# Altium footprint library HW_HOLLAND_NCDM_MONITOR_R1.PcbLib: 472 footprints (part 4 of 30)
Each footprint in its own frame and in the unit in brackets; x right, y up, seen from the top. Pads: shape width x height; smd on the part's side, far side on the other; paste and mask are expansions set on the pad; w line width, h text height; cw(c..) or ccw(c..) is an arc to the next point about the centre after c.
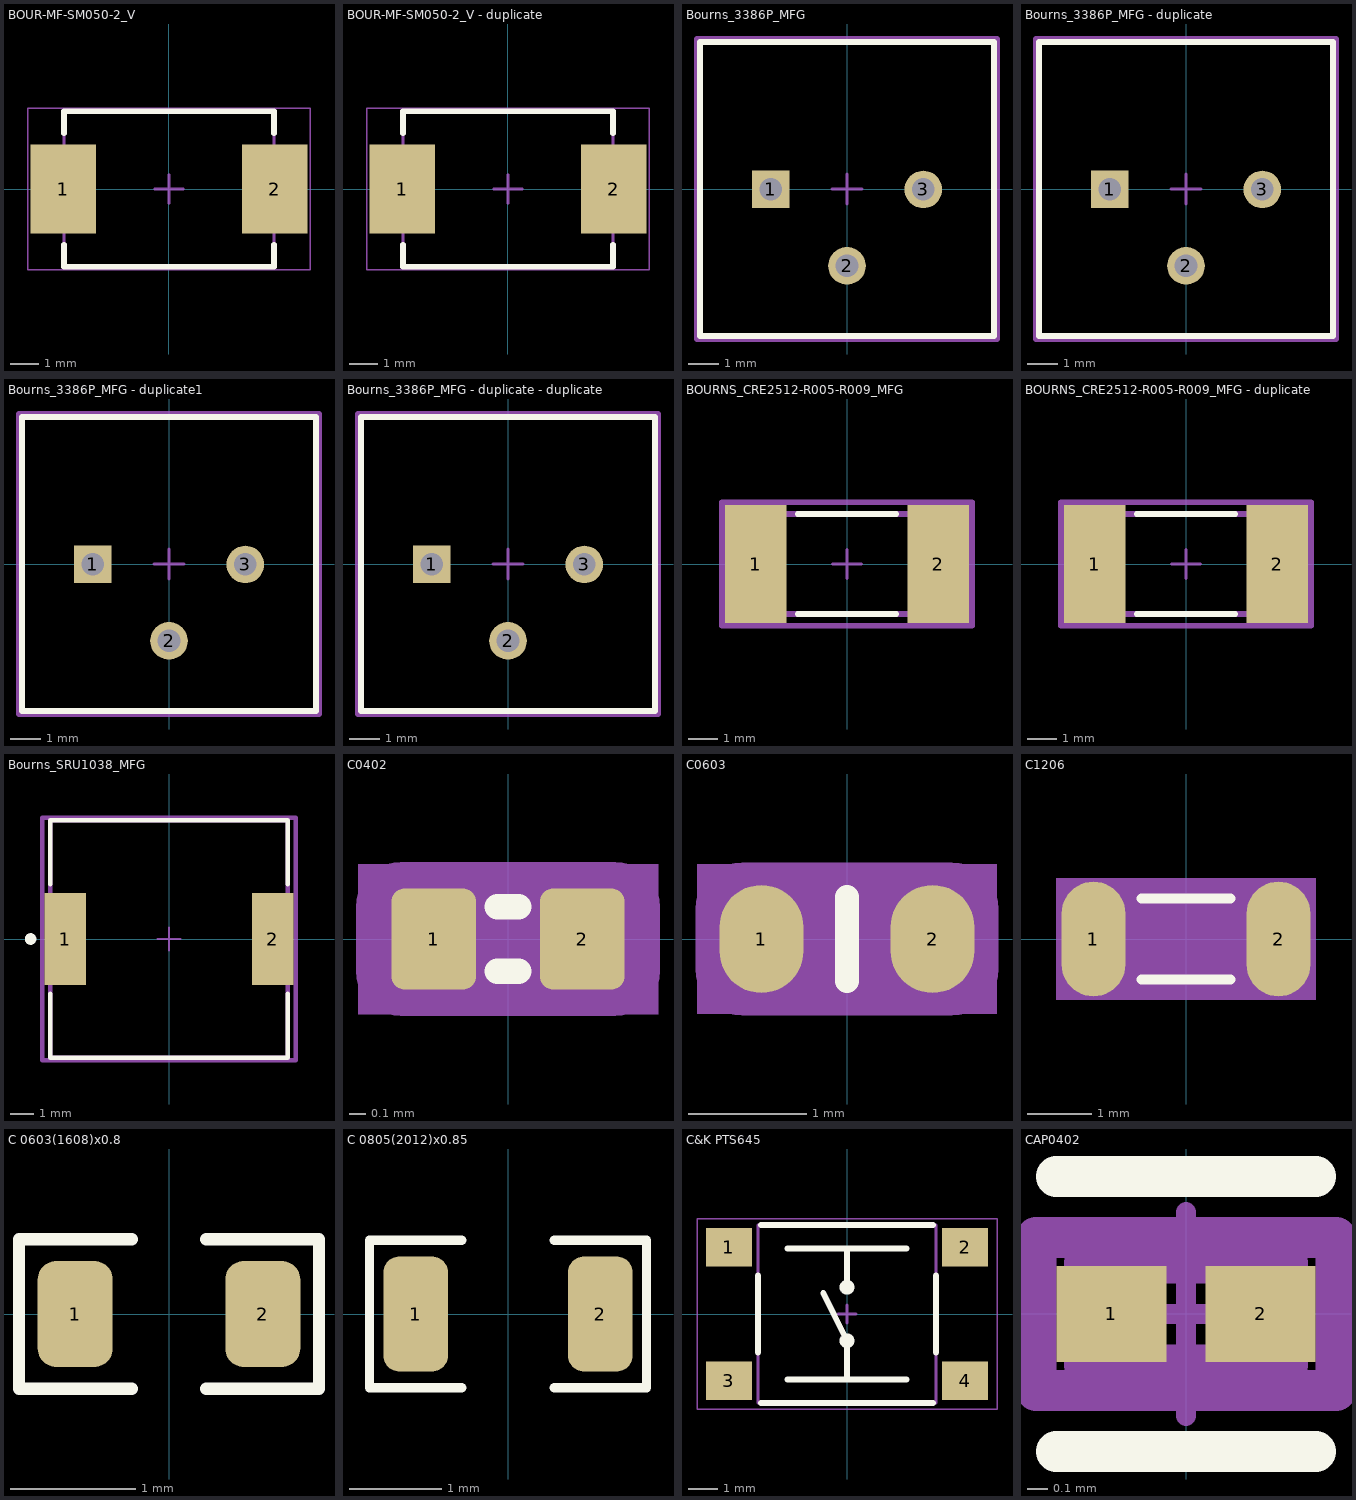
[diagram p3: the footprints below, top view; thin cyan lines are the x and y axes]

## BOUR-MF-SM050-2_V [mm]
pads (2):
  rect 2.3x3.1 smd: 1(-3.7,0) 2(3.7,0)
Top Overlay:
  lines w0.2: -3.677,-1.95 -3.677,-2.72 3.678,-2.72 3.678,-1.95 ; -3.677,1.95 -3.677,2.72 3.678,2.72 3.678,1.95
Mechanical 13:
  lines w0.1: -3.677,-2.72 -3.677,2.72 3.678,2.72 3.678,-2.72 -3.677,-2.72
Mechanical 15:
  lines w0.05: -4.95,-2.82 -4.95,2.82 4.95,2.82 4.95,-2.82 -4.95,-2.82
  lines w0.1: -0.5,0 0.5,0 ; 0,-0.5 0,0.5
3D body "mf-sm050.stp": height 3.18, standoff 0, extent -3.677,-2.72 3.678,2.72

## BOUR-MF-SM050-2_V - duplicate [mm]
pads (2):
  rect 2.3x3.1 smd: 1(-3.7,0) 2(3.7,0)
Top Overlay:
  lines w0.2: -3.677,-1.95 -3.677,-2.72 3.678,-2.72 3.678,-1.95 ; -3.677,1.95 -3.677,2.72 3.678,2.72 3.678,1.95
Mechanical 13:
  lines w0.1: -3.677,-2.72 3.678,-2.72 3.678,2.72 -3.677,2.72 -3.677,-2.72
Mechanical 15:
  lines w0.05: -4.95,-2.82 4.95,-2.82 4.95,2.82 -4.95,2.82 -4.95,-2.82
  lines w0.1: -0.5,0 0.5,0 ; 0,-0.5 0,0.5
3D body "mf-sm050.stp": height 3.18, standoff 0, extent -3.677,-2.72 3.678,2.72

## Bourns_3386P_MFG [mm]
pads (3):
  rect 1.25x1.25 hole 0.75 paste-2539.97 mask+0: 1(-2.54,-0.015)
  round 1.25 hole 0.75 paste-2539.97 mask+0: 2(0,-2.555) 3(2.54,-0.015)
Top Overlay:
  lines w0.2: -4.89,-4.89 -4.89,4.89 4.89,4.89 4.89,-4.89 -4.89,-4.89
Top Courtyard:
  lines w0.2: -4.99,-4.99 -4.99,4.99 4.99,4.99 4.99,-4.99 -4.99,-4.99
  text ".Designator" at 0,0 h1
Mechanical 12:
  lines w0.2: -4.89,-4.89 -4.89,4.89 4.89,4.89 4.89,-4.89 -4.89,-4.89
Mechanical 15:
  lines w0.1: -0.5,0 0.5,0 ; 0,-0.5 0,0.5
  lines w0.2: -4.99,-4.99 -4.99,4.99 4.99,4.99 4.99,-4.99 -4.99,-4.99
3D body "Res_Bourns_3386P-1-104LF_eec.STEP": height 0.25, standoff 0, extent -4.99,-4.99 4.99,4.99

## Bourns_3386P_MFG - duplicate [mm]
pads (3):
  rect 1.25x1.25 hole 0.75 paste-2539.97 mask+0: 1(-2.54,-0.015)
  round 1.25 hole 0.75 paste-2539.97 mask+0: 2(0,-2.555) 3(2.54,-0.015)
Top Overlay:
  lines w0.2: -4.89,-4.89 -4.89,4.89 4.89,4.89 4.89,-4.89 -4.89,-4.89
Top Courtyard:
  lines w0.2: -4.99,-4.99 -4.99,4.99 4.99,4.99 4.99,-4.99 -4.99,-4.99
  text ".Designator" at 0,0 h1
Mechanical 12:
  lines w0.2: -4.89,-4.89 -4.89,4.89 4.89,4.89 4.89,-4.89 -4.89,-4.89
Mechanical 15:
  lines w0.1: -0.5,0 0.5,0 ; 0,-0.5 0,0.5
  lines w0.2: -4.99,-4.99 -4.99,4.99 4.99,4.99 4.99,-4.99 -4.99,-4.99
3D body "Res_Bourns_3386P-1-104LF_eec.STEP": height 0.25, standoff 0, extent -4.99,-4.99 4.99,4.99

## Bourns_3386P_MFG - duplicate1 [mm]
pads (3):
  rect 1.25x1.25 hole 0.75 paste-2539.97 mask+0: 1(-2.54,-0.015)
  round 1.25 hole 0.75 paste-2539.97 mask+0: 2(0,-2.555) 3(2.54,-0.015)
Top Overlay:
  lines w0.2: -4.89,-4.89 4.89,-4.89 4.89,4.89 -4.89,4.89 -4.89,-4.89
Top Courtyard:
  lines w0.2: -4.99,-4.99 4.99,-4.99 4.99,4.99 -4.99,4.99 -4.99,-4.99
  text ".Designator" at 0,0 h1
Mechanical 12:
  lines w0.2: -4.89,-4.89 4.89,-4.89 4.89,4.89 -4.89,4.89 -4.89,-4.89
Mechanical 15:
  lines w0.1: -0.5,0 0.5,0 ; 0,-0.5 0,0.5
  lines w0.2: -4.99,-4.99 4.99,-4.99 4.99,4.99 -4.99,4.99 -4.99,-4.99
3D body "Res_Bourns_3386P-1-104LF_eec.STEP": height 0.25, standoff 0, extent -4.99,-4.99 4.99,4.99

## Bourns_3386P_MFG - duplicate - duplicate [mm]
pads (3):
  rect 1.25x1.25 hole 0.75 paste-2539.97 mask+0: 1(-2.54,-0.015)
  round 1.25 hole 0.75 paste-2539.97 mask+0: 2(0,-2.555) 3(2.54,-0.015)
Top Overlay:
  lines w0.2: -4.89,-4.89 -4.89,4.89 4.89,4.89 4.89,-4.89 -4.89,-4.89
Top Courtyard:
  lines w0.2: -4.99,-4.99 -4.99,4.99 4.99,4.99 4.99,-4.99 -4.99,-4.99
  text ".Designator" at 0,0 h1
Mechanical 12:
  lines w0.2: -4.89,-4.89 -4.89,4.89 4.89,4.89 4.89,-4.89 -4.89,-4.89
Mechanical 15:
  lines w0.1: -0.5,0 0.5,0 ; 0,-0.5 0,0.5
  lines w0.2: -4.99,-4.99 -4.99,4.99 4.99,4.99 4.99,-4.99 -4.99,-4.99
3D body "Res_Bourns_3386P-1-104LF_eec.STEP": height 0.25, standoff 0, extent -4.99,-4.99 4.99,4.99

## BOURNS_CRE2512-R005-R009_MFG [mm]
pads (2):
  rect 2.1x4 smd paste+0 mask+0: 1(-3.1,0) 2(3.1,0)
Top Overlay:
  lines w0.2: -1.675,-1.7 1.675,-1.7 ; -1.675,1.7 1.675,1.7
Top Courtyard:
  lines w0.2: -4.25,-2.1 4.25,-2.1 4.25,2.1 -4.25,2.1 -4.25,-2.1
  text ".Designator" at 0,0.188 h1
Mechanical 12:
  lines w0.2: -3.3,-1.7 3.3,-1.7 3.3,1.7 -3.3,1.7 -3.3,-1.7
Mechanical 15:
  lines w0.1: -0.5,0 0.5,0 ; 0,-0.5 0,0.5
  lines w0.2: -4.25,-2.1 4.25,-2.1 4.25,2.1 -4.25,2.1 -4.25,-2.1
3D body "Res_Bourns_CRE2512-FZ-R005E-3_eec.STEP": height 0.9, standoff 0, extent -3.2,-1.6 3.2,1.6

## BOURNS_CRE2512-R005-R009_MFG - duplicate [mm]
pads (2):
  rect 2.1x4 smd paste+0 mask+0: 1(-3.1,0) 2(3.1,0)
Top Overlay:
  lines w0.2: -1.675,-1.7 1.675,-1.7 ; -1.675,1.7 1.675,1.7
Top Courtyard:
  lines w0.2: -4.25,-2.1 4.25,-2.1 4.25,2.1 -4.25,2.1 -4.25,-2.1
  text ".Designator" at 0,0.188 h1
Mechanical 12:
  lines w0.2: -3.3,-1.7 3.3,-1.7 3.3,1.7 -3.3,1.7 -3.3,-1.7
Mechanical 15:
  lines w0.1: -0.5,0 0.5,0 ; 0,-0.5 0,0.5
  lines w0.2: -4.25,-2.1 4.25,-2.1 4.25,2.1 -4.25,2.1 -4.25,-2.1
3D body "Res_Bourns_CRE2512-FZ-R005E-3_eec.STEP": height 0.9, standoff 0, extent -3.2,-1.6 3.2,1.6

## Bourns_SRU1038_MFG [mm]
pads (2):
  rect 1.8x4 smd paste+0 mask+0: 1(-4.5,0) 2(4.5,0)
Top Overlay:
  circle w0.25: c-6,0 r0.125
  lines w0.2: -5.15,-2.375 -5.15,-5.15 5.15,-5.15 5.15,-2.375 ; -5.15,2.375 -5.15,5.15 5.15,5.15 5.15,2.375
Top Courtyard:
  lines w0.2: -5.5,-5.25 5.5,-5.25 5.5,5.25 -5.5,5.25 -5.5,-5.25
  text ".Designator" at 0,0.235 h1.25
Mechanical 12:
  lines w0.2: -5.15,-5.15 5.15,-5.15 5.15,5.15 -5.15,5.15 -5.15,-5.15
Mechanical 15:
  lines w0.1: -0.5,0 0.5,0 ; 0,-0.5 0,0.5
  lines w0.2: -5.5,-5.25 5.5,-5.25 5.5,5.25 -5.5,5.25 -5.5,-5.25
3D body "Ind_Bourns_SRU1038-470Y_eec.STEP": height 0.25, standoff 0, extent -5.5,-5.25 5.5,5.25

## C0402 [mm]
pads (2):
  rrect30% 0.499x0.6 smd: 1(-0.44,0) 2(0.44,0)
Top Overlay:
  lines w0.152: -0.064,-0.191 0.064,-0.191 ; -0.064,0.191 0.064,0.191
  text ".Designator" at 1.271,0.212 h0.64
Top Assembly:
  lines w0.025: -0.102,-0.051 0.102,-0.051 ; -0.102,0.051 0.102,0.051 ; 0,-0.178 0,-0.051 ; 0,0.051 0,0.178 ; -0.889,-0.19 ccw(c-0.635,-0.191) -0.635,-0.445 0.635,-0.445 ccw(c0.635,-0.191) 0.889,-0.191 0.889,0.191 ccw(c0.635,0.191) 0.635,0.445 -0.635,0.445 ccw(c-0.635,0.191) -0.889,0.191 -0.889,-0.191
Top 3D Body:
  region: -0.889,0.445 -0.889,-0.445 0.889,-0.445 0.889,0.445
Top Component Outline:
  lines w0.025: 0.25,-0.25 0.25,0.25 -0.25,0.25 -0.25,-0.25 -0.5,-0.25 ; -0.5,-0.25 -0.5,0.25 ; -0.5,-0.25 0.5,-0.25 0.5,0.25 -0.5,0.25 ; -0.5,-0.25 -0.5,0.25
Mechanical 17:
  text "2" at 0.806,0 h0.46
  text "1" at -0.074,0 h0.46
3D body: height 3.81, standoff 0, extent -0.889,-0.445 0.889,0.445

## C0603 [mil]
pads (2):
  oval 28x36 smd: 1(-28.51,0) 2(28.51,0)
Top Overlay:
  lines w8: 0,-14 0,14
  text ".Designator" at -37.51,-8.34 h25
Top Assembly:
  lines w1: -8,-3 8,-3 ; -8,4 8,4 ; 0,-14 0,-3 ; 0,4 0,15 ; -50,-10 ccw(c-35,-10) -35,-25 35,-25 ccw(c35,-10) 50,-10 50,10 ccw(c35,10) 35,25 -35,25 ccw(c-35,10) -50,10 -50,-10
  text "10uF/6/16V" at -44,-25 h50
Top 3D Body:
  region: -50,-25 50,-25 50,25 -50,25
Mechanical 17:
  text "1" at -28.51,-38.4 h48
  text "2" at 28.51,-38.4 h48
3D body: height 150, standoff 0, extent -50,-25 50,25

## C1206 [mm]
pads (2):
  oval 1x1.8 smd: 1(-1.45,0) 2(1.45,0)
Top Overlay:
  lines w0.152: -0.699,-0.635 0.699,-0.635 ; -0.699,0.635 0.699,0.635
Top Assembly:
  lines w0.025: -0.257,-0.127 0.251,-0.127 ; -0.257,0.127 0.251,0.127 ; 0,-0.572 0,-0.127 ; -0.003,0.127 -0.003,0.572 -0.003,0.127
  text ".Designator" at 1.27,0.212 h0.64
Top 3D Body:
  region: -2.032,0.953 2.032,0.953 2.032,-0.953 -2.032,-0.953
Top Component Outline:
  lines w0.025: -1,-0.8 1,-0.8 ; -1,-0.8 -1,0.8 ; -1,-0.8 -1.6,-0.8 -1.6,0.8 -1,0.8 ; -1,0.8 1,0.8 ; 1,-0.8 1.6,-0.8 1.6,0.8 1,0.8 ; 1,-0.8 1,0.8
Mechanical 17:
  text "2" at 1.45,-0.183 h0.46
  text "1" at -1.45,-0.183 h0.46
3D body: height 3.81, standoff 0, extent -2.032,-0.953 2.032,0.953

## C 0603(1608)x0.8 [mm]
height 0.52
pads (2):
  rrect50% 0.6x0.85 smd: 1(-0.75,0) 2(0.75,0)
Top Overlay:
  lines w0.1: -0.3,-0.6 -1.2,-0.6 -1.2,0.6 -0.3,0.6 ; 0.3,-0.6 1.2,-0.6 1.2,0.6 0.3,0.6
3D body "Cap 0603(1608)x80N.STEP": height 0.81, standoff 0, extent -0.8,-0.4 0.8,0.4

## C 0805(2012)x0.85 [mm]
height 0.52
pads (2):
  rrect50% 0.7x1.25 smd: 1(-1,0) 2(1,0)
Top Overlay:
  lines w0.1: -0.5,-0.8 -1.5,-0.8 -1.5,0.8 -0.5,0.8 ; 0.5,-0.8 1.5,-0.8 1.5,0.8 0.5,0.8
3D body "Cap 0805(2012)x85N.STEP": height 0.86, standoff 0, extent -1,-0.625 1,0.625

## C&K PTS645 [mm] "T-Switch, 4-leads, body 6x6mm, C&K PTS645SM43SMTR92 LFS"
height 4.4
pads (4):
  rect 1.55x1.3 smd mask+0.1: 1(-3.975,2.25) 2(3.975,2.25) 3(-3.975,-2.25) 4(3.975,-2.25)
Top Overlay:
  circle w0.2: c0,0.9 r0.15
  circle w0.2: c0,-0.9 r0.15
  lines w0.2: -3,-1.3 -3,1.3 ; -2.9,-3 2.9,-3 ; -2.9,3 2.9,3 ; -2,-2.2 2,-2.2 ; -2,2.2 2,2.2 ; -0.8,0.7 0,-0.9 0,-2.2 ; 0,0.9 0,2.2 ; 3,-1.3 3,1.3
Mechanical 13:
  lines w0.1: -3,-3 3,-3 3,3 -3,3 -3,-3
Mechanical 15:
  lines w0.05: -5.05,-3.2 5.05,-3.2 5.05,3.2 -5.05,3.2 -5.05,-3.2
  lines w0.1: -0.3,0 0.3,0 ; 0,-0.3 0,0.3
3D body "C&K - PTS645 SMT.step": height 4.4, standoff 0, extent -4.5,-3 4.5,3

## CAP0402 [mm]
pads (2):
  rect 0.539x0.472 smd paste+0 mask+0: 1(-0.367,0) 2(0.367,0)
Top Overlay:
  lines w0.2: -0.636,-0.675 0.636,-0.675 ; -0.636,0.675 0.636,0.675
Top Courtyard:
  lines w0.2: -0.736,-0.375 -0.736,0.375 0.736,0.375 0.736,-0.375 -0.736,-0.375
  text ".Designator" at 0,0.235 h1.25
Mechanical 12:
  lines w0.2: -0.5,-0.25 -0.5,0.25 0.5,0.25 0.5,-0.25 -0.5,-0.25
Mechanical 15:
  lines w0.1: -0.5,0 0.5,0 ; 0,-0.5 0,0.5
  lines w0.2: -0.736,-0.375 -0.736,0.375 0.736,0.375 0.736,-0.375 -0.736,-0.375
3D body "Cap_TDK_C1005X7S2A103K050BB_eec.STEP": height 0.55, standoff 0, extent -0.5,-0.25 0.5,0.25